# Altium footprint library gpa_connectors.PcbLib: 22 footprints (part 1 of 2)
Each footprint in its own frame and in the unit in brackets; x right, y up, seen from the top. Pads: shape width x height; smd on the part's side, far side on the other; paste and mask are expansions set on the pad; w line width, h text height; cw(c..) or ccw(c..) is an arc to the next point about the centre after c.
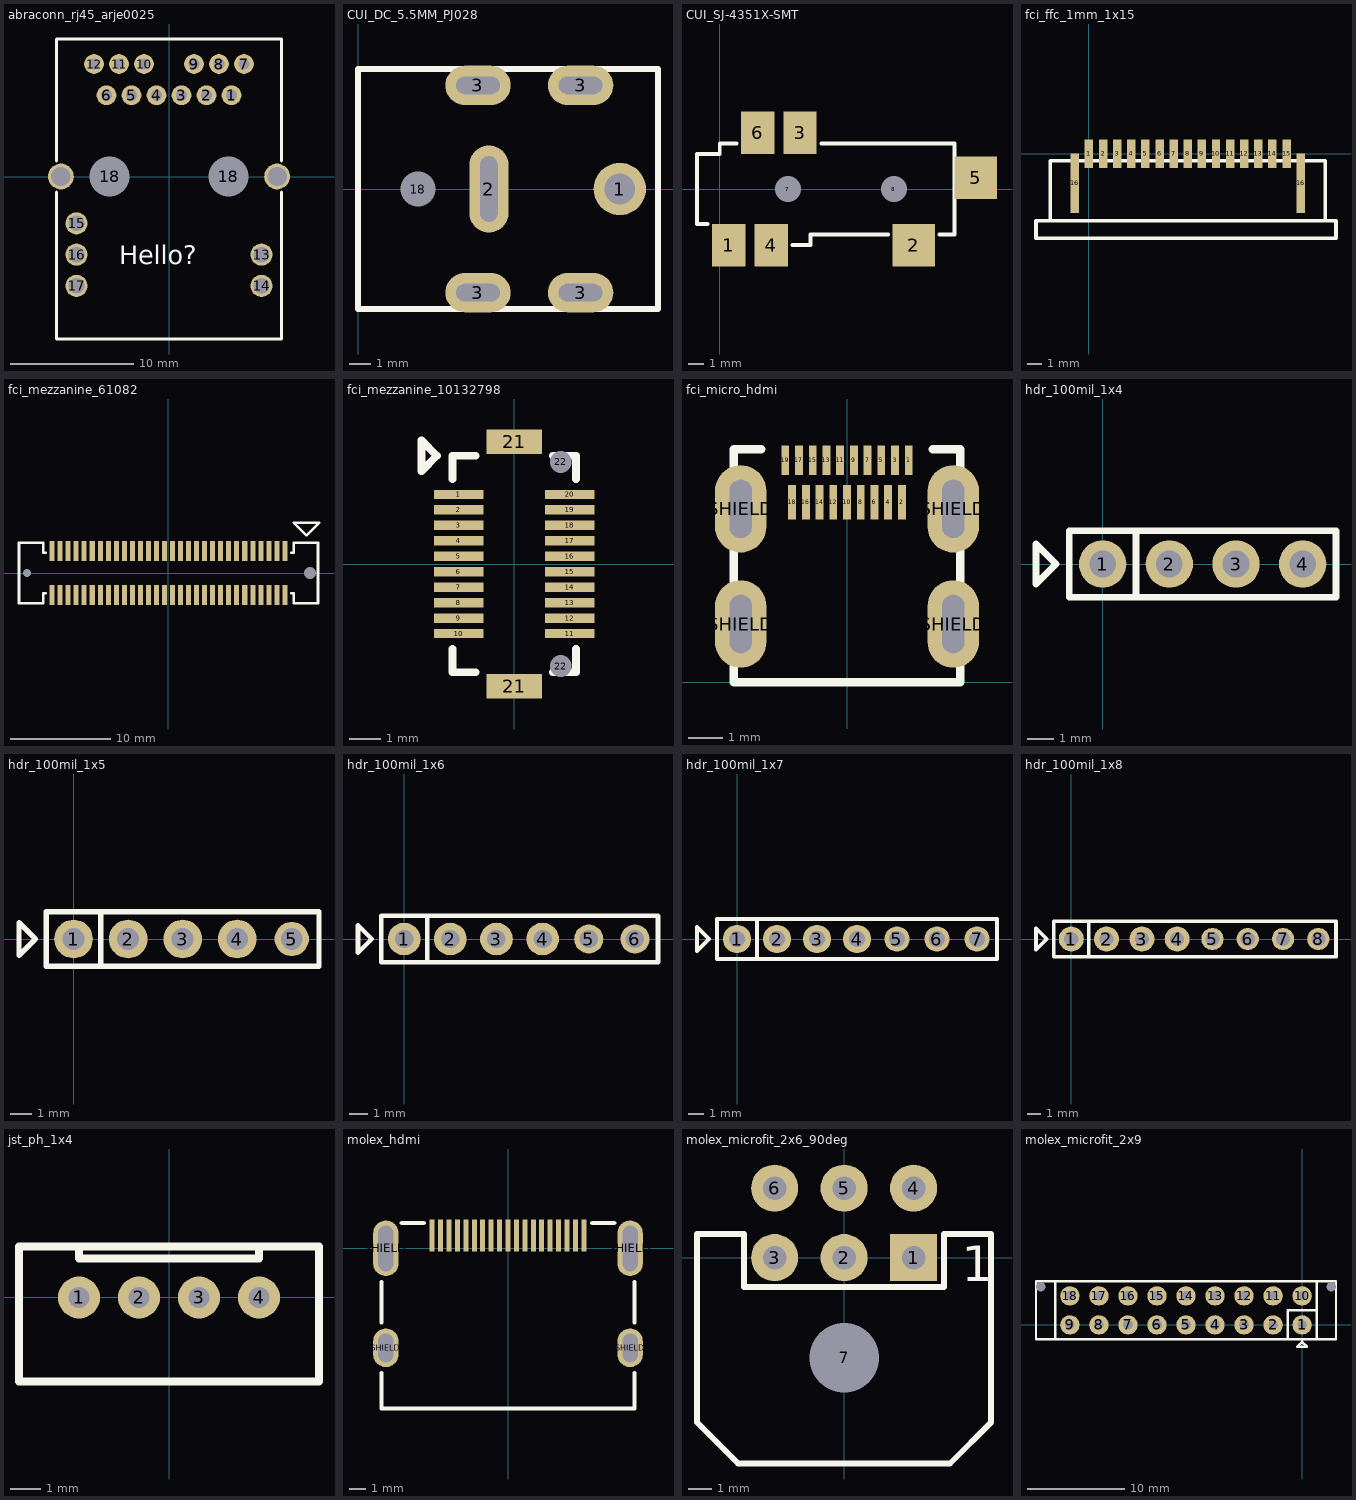
[diagram p0: the footprints below, top view; thin cyan lines are the x and y axes]

## abraconn_rj45_arje0025 [mm]
pads (21):
  round 1.6 hole 0.9: 1(5.08,6.604) 2(3.048,6.604) 3(1.016,6.604) 4(-1.016,6.604) 5(-3.048,6.604) 6(-5.08,6.604) 7(6.096,9.144) 8(4.064,9.144) 9(2.032,9.144) 10(-2.032,9.144) 11(-4.064,9.144) 12(-6.096,9.144)
  round 1.8 hole 1.27: 13(7.518,-6.35) 14(7.518,-8.89) 15(-7.518,-3.81) 16(-7.518,-6.35) 17(-7.518,-8.89)
  round 2.1 hole 3.251: 18(-4.826,0) 18(4.826,0)
  round 2.1 hole 1.57: SHIELD(-8.788,0) SHIELD(8.788,0)
Top Overlay:
  lines w0.254: -9.144,-1.27 -9.144,-13.208 9.144,-13.208 9.144,-1.27 ; -9.144,1.27 -9.144,11.176 7.874,11.176 9.144,11.176 9.144,1.27
  text "Hello?" at -4.064,-7.112 h1.52
3D body "ARJE-0025.STEP": height 15.35, standoff -2.96, extent -10.338,-13.207 10.339,11.174

## CUI_DC_5.5MM_PJ028 [mm] "2.5MM 5.5MM PJ-028BH"
pads (7):
  round 2.4 hole 1.4: 1(12,0)
  rrect100% 1.8x4 hole 0.8 slot 3 at 90 deg: 2(6,0)
  rrect100% 3x1.8 hole 0.8 slot 2 at 0 deg: 3(5.5,-4.75) 3(5.5,4.75) 3(10.2,-4.75) 3(10.2,4.75)
  round 0.9 hole 1.6: 18(2.75,0)
Top Overlay:
  lines w0.254: 0,-5.5 13.75,-5.5 13.75,5.5 0,5.5 0,0 0,-5.5
3D body "pj-082bh.stp": height 10.15, standoff -2.05, extent -0.03,-5.1 13.1,5.1

## CUI_SJ-4351X-SMT [mm] "3.5mm Headphone connectoor by CUI"
pads (8):
  rect 2.2x2.8 smd: 1(0.6,-3.7) 3(5.3,3.7) 4(3.4,-3.7) 6(2.5,3.7)
  rect 2.8x2.8 smd: 2(12.8,-3.7) 5(16.9,0.75)
  round 0.5 hole 1.7: 7(4.5,0) 8(11.5,0)
Top Overlay:
  lines w0.254: -0.8,-2.3 -1.5,-2.3 -1.5,2.3 0,2.3 0,3 1.1,3 ; 4.8,-3.7 6,-3.7 6,-3 11.1,-3 ; 6.7,3 15.5,3 15.5,-3 14.5,-3
3D body "sj-43514-smt.stp": height 5.1, standoff -0.7, extent -1.7,-4.5 15.5,4.5

## fci_ffc_1mm_1x15 [mm]
pads (17):
  rect 0.6x2 smd: 1(0,0) 2(1,0) 3(2,0) 4(3,0) 5(4,0) 6(5,0) 7(6,0) 8(7,0) 9(8,0) 10(9,0) 11(10,0) 12(11,0) 13(12,0) 14(13,0) 15(14,0)
  rect 0.6x4.2 smd: 16(-1,-2.1) 16(15,-2.1)
Top Overlay:
  lines w0.254: -2.75,-4.75 16.75,-4.75 ; -2.75,-4.75 -2.75,-0.5 16.75,-0.5 16.75,-4.75 ; -2.75,-4.75 -3.75,-4.75 -3.75,-6 17.5,-6 17.5,-4.75 16.75,-4.75
3D body: height 2.7, standoff 0, extent -3.749,-5.999 17.499,-4.751
3D body: height 2.7, standoff 0, extent -2.749,-4.749 16.749,-0.501

## fci_mezzanine_61082 [mm]
pads (63):
  rect 0.5x2 smd: 1(11.6,2.2) 2(11.6,-2.2) 2(11.6,-2.2) 3(10.8,2.2) 4(10.8,-2.2) 5(10,2.2) 6(10,-2.2) 7(9.2,2.2) 8(9.2,-2.2) 9(8.4,2.2) 10(8.4,-2.2) 11(7.6,2.2) 12(7.6,-2.2) 13(6.8,2.2) 14(6.8,-2.2) 15(6,2.2) 16(6,-2.2) 17(5.2,2.2) 18(5.2,-2.2) 19(4.4,2.2) 20(4.4,-2.2) 21(3.6,2.2) 22(3.6,-2.2) 23(2.8,2.2) 24(2.8,-2.2) 25(2,2.2) 26(2,-2.2) 27(1.2,2.2) 28(1.2,-2.2) 29(0.4,2.2) 30(0.4,-2.2) 31(-0.4,2.2) 32(-0.4,-2.2) 33(-1.2,2.2) 34(-1.2,-2.2) 35(-2,2.2) 36(-2,-2.2) 37(-2.8,2.2) 38(-2.8,-2.2) 39(-3.6,2.2) 40(-3.6,-2.2) 41(-4.4,2.2) 42(-4.4,-2.2) 43(-5.2,2.2) 44(-5.2,-2.2) 45(-6,2.2) 46(-6,-2.2) 47(-6.8,2.2) 48(-6.8,-2.2) 49(-7.6,2.2) 50(-7.6,-2.2) 51(-8.4,2.2) 52(-8.4,-2.2) 53(-9.2,2.2) 54(-9.2,-2.2) 55(-10,2.2) 56(-10,-2.2) 57(-10.8,2.2) 58(-10.8,-2.2) 59(-11.6,2.2) 60(-11.6,-2.2)
  round 0.5 hole 0.8: PEG(-14.1,0)
  round 0.5 hole 1.2: PEG(14.1,0)
Top Overlay:
  lines w0.254: -12.25,-2 -12.5,-2 -12.5,-3 ; -12.25,2 -12.5,2 -12.5,3 -14.9,3 ; 12.25,-2 12.5,-2 12.5,-3 14.9,-3 ; 12.25,2 12.5,2 12.5,3 ; -14.9,3 -14.9,-3 -12.5,-3 ; -14.9,3 -14.9,3 ; -12.5,-3 -12.5,-3 ; 12.5,3 12.5,3 ; 12.5,3 14.9,3 14.9,-3 ; 14.9,-3 14.9,-3 ; 12.5,5 15,5 13.75,3.75 12.5,5
3D body "s61082-061x0xxx.stp": height 3.7, standoff -0.65, extent -14.9,-3 14.9,3

## fci_mezzanine_10132798 [mm]
pads (24):
  rect 1.6x0.3 smd: 1(-1.8,2.25) 2(-1.8,1.75) 3(-1.8,1.25) 4(-1.8,0.75) 5(-1.8,0.25) 6(-1.8,-0.25) 7(-1.8,-0.75) 8(-1.8,-1.25) 9(-1.8,-1.75) 10(-1.8,-2.25) 11(1.8,-2.25) 12(1.8,-1.75) 13(1.8,-1.25) 14(1.8,-0.75) 15(1.8,-0.25) 16(1.8,0.25) 17(1.8,0.75) 18(1.8,1.25) 19(1.8,1.75) 20(1.8,2.25)
  rect 1.8x0.8 smd: 21(0,-3.95) 21(0,3.95)
  round 0.5 hole 0.7: 22(1.5,-3.3) 22(1.5,3.3)
Top Overlay:
  lines w0.254: -2,-2.75 -2,-3.5 -1.25,-3.5 ; -2,2.75 -2,3.5 -1.25,3.5 ; 1.25,-3.5 2,-3.5 2,-2.75 ; 1.25,3.5 2,3.5 2,2.75 ; -3,3 -3,3.75 -3,4 -2.5,3.5 -3,3
3D body "10132798-021100LF.stp": height 2.13, standoff -0.42, extent -2.3,-4 2.3,4

## fci_micro_hdmi [mm] "10118242-001RLF"
pads (23):
  rect 0.23x0.85 smd: 1(1.8,6.475) 3(1.4,6.475) 5(1,6.475) 7(0.6,6.475) 9(0.2,6.475) 11(-0.2,6.475) 13(-0.6,6.475) 15(-1,6.475) 17(-1.4,6.475) 19(-1.8,6.475)
  rect 0.23x1 smd: 2(1.6,5.25) 4(1.2,5.25) 6(0.8,5.25) 8(0.4,5.25) 10(0,5.25) 12(-0.4,5.25) 14(-0.8,5.25) 16(-1.2,5.25) 18(-1.6,5.25)
  rrect100% 1.5x2.55 hole 0.65 slot 1.7 at 90 deg: SHIELD(-3.1,1.7) SHIELD(-3.1,5.06) SHIELD(3.1,1.7) SHIELD(3.1,5.06)
Top Overlay:
  lines w0.254: -2.5,6.8 -3.3,6.8 -3.3,0 3.3,0 3.3,6.8 2.5,6.8
3D body "10118242-001RLF.STP": height 3.03, standoff -0.5, extent -3.25,-0.7 3.25,6.8

## hdr_100mil_1x4 [mm]
pads (4):
  round 1.8 hole 1.016: 1(0,0) 2(2.54,0) 3(5.08,0) 4(7.62,0)
Top Overlay:
  lines w0.254: 1.27,-1.27 1.27,1.27 ; -2.54,-0.762 -2.54,0.762 -1.778,0 -2.54,-0.762 ; -1.27,-1.27 -1.27,1.27 8.89,1.27 8.89,-1.27 -1.27,-1.27
3D body "Pin Header 1x4 TH Pitch 2.54mm.stp": height 9.5, standoff -3.2, extent -1.27,-1.27 8.89,1.27

## hdr_100mil_1x5 [mm]
pads (5):
  round 1.8 hole 1.016: 1(0,0) 2(2.54,0) 3(5.08,0) 4(7.62,0)
  round 1.6 hole 1.016: 5(10.16,0)
Top Overlay:
  lines w0.254: 1.27,-1.27 1.27,1.27 ; -2.54,-0.762 -2.54,0.762 -1.778,0 -2.54,-0.762 ; -1.27,-1.27 11.43,-1.27 11.43,1.27 -1.27,1.27 -1.27,-1.27
3D body "Pin Header 1x5 TH Pitch 2.54mm.stp": height 9.5, standoff -3.2, extent -1.27,-1.27 11.43,1.27

## hdr_100mil_1x6 [mm]
pads (6):
  round 1.8 hole 1.016: 1(0,0) 2(2.54,0) 3(5.08,0) 4(7.62,0)
  round 1.6 hole 1.016: 5(10.16,0) 6(12.7,0)
Top Overlay:
  lines w0.254: 1.27,-1.27 1.27,1.27 ; -2.54,-0.762 -2.54,0.762 -1.778,0 -2.54,-0.762 ; -1.27,-1.27 13.97,-1.27 13.97,1.27 -1.27,1.27 -1.27,-1.27
3D body "Pin Header 1x6 TH Pitch 2.54mm.stp": height 9.5, standoff -3.2, extent -1.27,-1.27 13.97,1.27

## hdr_100mil_1x7 [mm]
pads (7):
  round 1.8 hole 1.016: 1(0,0) 2(2.54,0) 3(5.08,0) 4(7.62,0)
  round 1.6 hole 1.016: 5(10.16,0) 6(12.7,0) 7(15.24,0)
Top Overlay:
  lines w0.254: 1.27,-1.27 1.27,1.27 ; -2.54,-0.762 -1.778,0 -2.54,0.762 -2.54,-0.762 ; -1.27,-1.27 -1.27,1.27 16.51,1.27 16.51,-1.27 -1.27,-1.27
3D body "Pin Header 1x7 TH Pitch 2.54mm.stp": height 9.5, standoff -3.2, extent -1.27,-1.27 16.51,1.27

## hdr_100mil_1x8 [mm]
pads (8):
  round 1.8 hole 1.016: 1(0,0) 2(2.54,0) 3(5.08,0) 4(7.62,0)
  round 1.6 hole 1.016: 5(10.16,0) 6(12.7,0) 7(15.24,0) 8(17.78,0)
Top Overlay:
  lines w0.254: 1.27,-1.27 1.27,1.27 ; -2.54,-0.762 -2.54,0.762 -1.778,0 -2.54,-0.762 ; -1.27,-1.27 19.05,-1.27 19.05,1.27 -1.27,1.27 -1.27,-1.27
3D body "Pin Header 1x8 TH Pitch 2.54mm.stp": height 9.5, standoff -3.2, extent -1.27,-1.27 19.05,1.27

## jst_ph_1x4 [mm]
pads (4):
  round 1.4 hole 0.7: 1(-3,0) 2(-1,0) 3(1,0) 4(3,0)
Top Overlay:
  lines w0.254: -3,1.7 -3,1.3 3,1.3 3,1.7 ; -5,-2.8 -5,1.7 5,1.7 5,-2.8 -5,-2.8

## molex_hdmi [mm] "47151-0001"
pads (23):
  rect 0.3x1.9 smd: 1(4.5,0.76) 2(4,0.76) 3(3.5,0.76) 4(3,0.76) 5(2.5,0.76) 6(2,0.76) 7(1.5,0.76) 8(1,0.76) 9(0.5,0.76) 10(0,0.76) 11(-0.5,0.76) 12(-1,0.76) 13(-1.5,0.76) 14(-2,0.76) 15(-2.5,0.76) 16(-3,0.76) 17(-3.5,0.76) 18(-4,0.76) 19(-4.5,0.76)
  oval 1.5x2.3 hole 0.9 slot 1.7 at 90 deg: SHIELD(-7.25,-5.9) SHIELD(7.25,-5.9)
  oval 1.5x3.3 hole 0.9 slot 2.7 at 90 deg: SHIELD(-7.25,0) SHIELD(7.25,0)
Top Overlay:
  lines w0.254: -7.5,-7.4 -7.5,-9.5 7.5,-9.5 7.5,-7.4 ; -7.5,-4.4 -7.5,-2 ; -6.3,1.5 -5,1.5 ; 5,1.5 6.3,1.5 ; 7.5,-4.4 7.5,-2
3D body "471510001.stp": height 6.18, standoff -2.2, extent -7.5,-10.55 7.5,1.6

## molex_microfit_2x6_90deg [mil]
pads (7):
  rect 80x80 hole 40: 1(118.11,0)
  round 80 hole 40: 2(0,0) 3(-118.11,0) 4(118.11,118.11) 5(0,118.11) 6(-118.11,118.11)
  round 35.43 hole 118.11: 7(0,-170)
Top Overlay:
  lines w10: -250,-280 -180,-350 180,-350 250,-280 250,40 170,40 170,-50 -170,-50 -170,40 -250,40 -250,-280
  text "1" at 200,-40 h60

## molex_microfit_2x9 [mm]
pads (20):
  round 2 hole 1: 1(0,0) 2(-3,0) 3(-6,0) 4(-9,0) 5(-12,0) 6(-15,0) 7(-18,0) 8(-21,0) 9(-24,0) 10(0,3) 11(-3,3) 12(-6,3) 13(-9,3) 14(-12,3) 15(-15,3) 16(-18,3) 17(-21,3) 18(-24,3)
  round 0.5 hole 1: 28(-27,3.94) 28(3,3.94)
Top Overlay:
  lines w0.254: -25.5,-1.5 -25.5,4.5 ; 1.5,-1.5 1.5,4.5 ; 1.5,1.5 -1.5,1.5 ; -1.5,-1.5 -1.5,-1.5 ; -1.5,-1.5 -1.5,1.5 ; -1.5,1.5 -1.5,1.5 ; 0,-1.75 0.5,-2.25 -0.5,-2.25 0,-1.75 ; 0,-1.75 0,-1.75 ; -27.5,-1.5 3.5,-1.5 3.5,4.5 -27.5,4.5 -27.5,-1.5
3D body: height 9, standoff 0, extent 1.5,-1.5 3.5,4.5
3D body: height 9, standoff 0, extent -27.5,-1.5 -25.5,4.5
3D body: height 9.91, standoff 0, extent -2,-1 -1,1
3D body: height 9.91, standoff 0, extent -5,-1 -4,1
3D body: height 9.91, standoff 0, extent -8,-1 -7,1
3D body: height 9.91, standoff 0, extent -11,-1 -10,1
3D body: height 9.91, standoff 0, extent -14,-1 -13,1
3D body: height 9.91, standoff 0, extent -17,-1 -16,1
3D body: height 9.91, standoff 0, extent -20,-1 -19,1
3D body: height 9.91, standoff 0, extent -23,-1 -22,1
3D body: height 9.91, standoff 0, extent -2,2 -1,4
3D body: height 9.91, standoff 0, extent -5,2 -4,4
3D body: height 9.91, standoff 0, extent -8,2 -7,4
3D body: height 9.91, standoff 0, extent -11,2 -10,4
3D body: height 9.91, standoff 0, extent -14,2 -13,4
3D body: height 9.91, standoff 0, extent -17,2 -16,4
3D body: height 9.91, standoff 0, extent -20,2 -19,4
3D body: height 9.91, standoff 0, extent -23,2 -22,4
3D body: height 9.91, standoff 0, extent -25,1 1,2
3D body: height 9.91, standoff 0, extent -25,-1.5 1,-1
3D body: height 9.91, standoff 0, extent -25,4 1,4.5
3D body: height 9.91, standoff 0, extent 1,-1.5 1.5,4.5
3D body: height 9.91, standoff 0, extent -25.5,-1.5 -25,4.5
3D body: height 1, standoff 0.5, extent -1,-1 1,1
3D body: height 1, standoff 0.5, extent -4,-1 -2,1
3D body: height 1, standoff 0.5, extent -7,-1 -5,1
3D body: height 1, standoff 0.5, extent -10,-1 -8,1
3D body: height 1, standoff 0.5, extent -13,-1 -11,1
3D body: height 1, standoff 0.5, extent -16,-1 -14,1
3D body: height 1, standoff 0.5, extent -19,-1 -17,1
3D body: height 1, standoff 0.5, extent -22,-1 -20,1
3D body: height 1, standoff 0.5, extent -25,-1 -23,1
3D body: height 1, standoff 0.5, extent -1,2 1,4
3D body: height 1, standoff 0.5, extent -4,2 -2,4
3D body: height 1, standoff 0.5, extent -7,2 -5,4
3D body: height 1, standoff 0.5, extent -10,2 -8,4
3D body: height 1, standoff 0.5, extent -13,2 -11,4
3D body: height 1, standoff 0.5, extent -16,2 -14,4
3D body: height 1, standoff 0.5, extent -19,2 -17,4
3D body: height 1, standoff 0.5, extent -22,2 -20,4
3D body: height 1, standoff 0.5, extent -25,2 -23,4
3D body: height 1, standoff 0.5, extent -25,2 -23,4
3D body: height 8, standoff -3, extent -0.25,2.75 0.25,3.25
3D body: height 8, standoff -3, extent -3.25,2.75 -2.75,3.25
3D body: height 8, standoff -3, extent -6.25,2.75 -5.75,3.25
3D body: height 8, standoff -3, extent -9.25,2.75 -8.75,3.25
3D body: height 8, standoff -3, extent -12.25,2.75 -11.75,3.25
3D body: height 8, standoff -3, extent -15.25,2.75 -14.75,3.25
3D body: height 8, standoff -3, extent -18.25,2.75 -17.75,3.25
3D body: height 8, standoff -3, extent -21.25,2.75 -20.75,3.25
3D body: height 8, standoff -3, extent -24.25,2.75 -23.75,3.25
3D body: height 8, standoff -3, extent -0.25,-0.25 0.25,0.25
3D body: height 8, standoff -3, extent -3.25,-0.25 -2.75,0.25
3D body: height 8, standoff -3, extent -6.25,-0.25 -5.75,0.25
3D body: height 8, standoff -3, extent -9.25,-0.25 -8.75,0.25
3D body: height 8, standoff -3, extent -12.25,-0.25 -11.75,0.25
3D body: height 8, standoff -3, extent -15.25,-0.25 -14.75,0.25
3D body: height 8, standoff -3, extent -18.25,-0.25 -17.75,0.25
3D body: height 8, standoff -3, extent -21.25,-0.25 -20.75,0.25
3D body: height 8, standoff -3, extent -24.25,-0.25 -23.75,0.25